# Altium footprint library Mech.PcbLib: 75 footprints (part 4 of 5)
Each footprint in its own frame and in the unit in brackets; x right, y up, seen from the top. Pads: shape width x height; smd on the part's side, far side on the other; paste and mask are expansions set on the pad; w line width, h text height; cw(c..) or ccw(c..) is an arc to the next point about the centre after c.
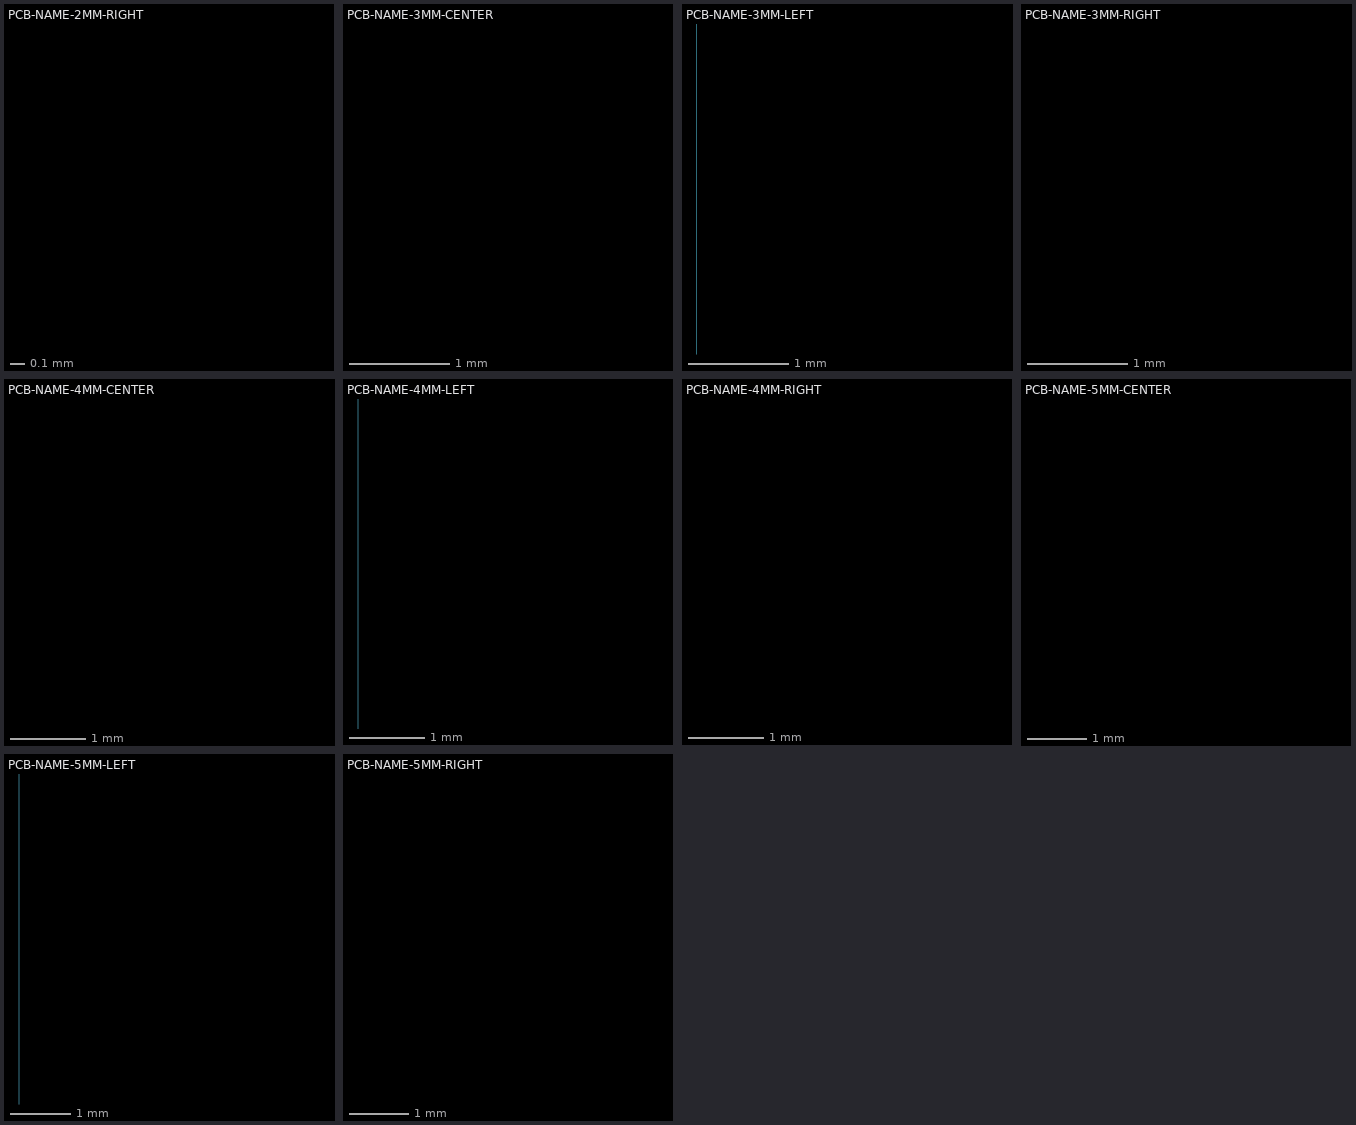
[diagram p3: the footprints below, top view; thin cyan lines are the x and y axes]

## PCB-NAME-2MM-RIGHT [mm]
Top Overlay:
  text "'.PCB_NAME''.Index_Main'" at -21.291,0.355 h2

## PCB-NAME-3MM-CENTER [mm]
Top Overlay:
  text "'.PCB_NAME''.Index_Main'" at -15.968,0.532 h3

## PCB-NAME-3MM-LEFT [mm]
Top Overlay:
  text "'.PCB_NAME''.Index_Main'" at 0,0.532 h3

## PCB-NAME-3MM-RIGHT [mm]
Top Overlay:
  text "'.PCB_NAME''.Index_Main'" at -31.937,0.532 h3

## PCB-NAME-4MM-CENTER [mm]
Top Overlay:
  text "'.PCB_NAME''.Index_Main'" at -21.291,0.71 h4

## PCB-NAME-4MM-LEFT [mm]
Top Overlay:
  text "'.PCB_NAME''.Index_Main'" at 0,0.71 h4

## PCB-NAME-4MM-RIGHT [mm]
Top Overlay:
  text "'.PCB_NAME''.Index_Main'" at -42.582,0.71 h4

## PCB-NAME-5MM-CENTER [mm]
Top Overlay:
  text "'.PCB_NAME''.Index_Main'" at -26.614,0.887 h5

## PCB-NAME-5MM-LEFT [mm]
Top Overlay:
  text "'.PCB_NAME''.Index_Main'" at 0,0.887 h5

## PCB-NAME-5MM-RIGHT [mm]
Top Overlay:
  text "'.PCB_NAME''.Index_Main'" at -53.228,0.887 h5

## QR-PROJECT-URL-5MM [mm] "QR Code Project URL 5mm"
Top Overlay:
  text ".Project_URL" at -2.5,-2.5 h2

## QR-PROJECT-URL-10MM [mm] "QR Code Project URL 10mm"
Top Overlay:
  text ".Project_URL" at -5,-5 h2

## QR-PROJECT-URL-15MM [mm] "QR Code Project URL 15mm"
Top Overlay:
  text ".Project_URL" at -7.5,-7.5 h2

## QR-PROJECT-URL-20MM [mm] "QR Code Project URL 20mm"
Top Overlay:
  text ".Project_URL" at -10,-10 h2

## QR-PROJECT-URL-25MM [mm] "QR Code Project URL 25mm"
Top Overlay:
  text ".Project_URL" at -12.5,-12.5 h2

## QR-PROJECT-URL-30MM [mm] "QR Code Project URL 30mm"
Top Overlay:
  text ".Project_URL" at -15,-15 h2